# Altium footprint library 1.10-电容.PcbLib: 188 footprints (part 1 of 12)
Each footprint in its own frame and in the unit in brackets; x right, y up, seen from the top. Pads: shape width x height; smd on the part's side, far side on the other; paste and mask are expansions set on the pad; w line width, h text height; cw(c..) or ccw(c..) is an arc to the next point about the centre after c.
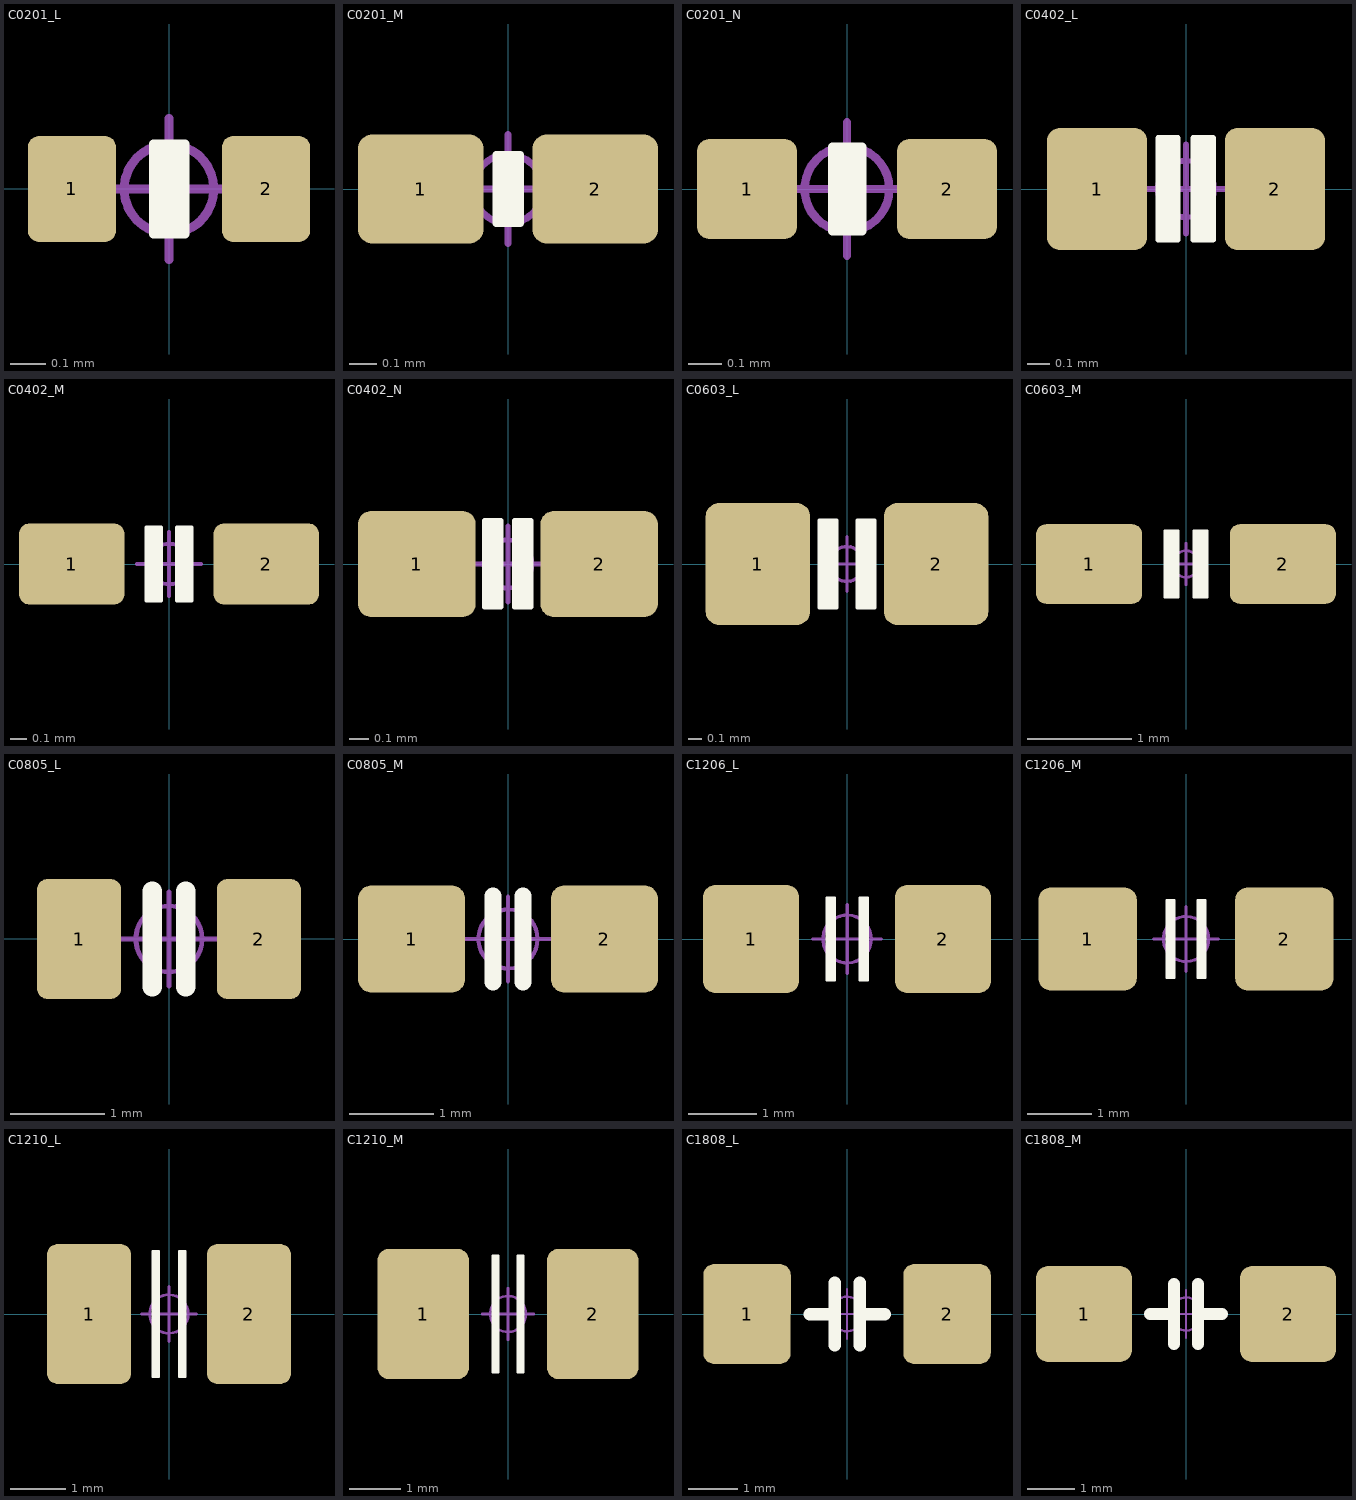
[diagram p0: the footprints below, top view; thin cyan lines are the x and y axes]

## C0201_L [mm] "无极性贴片电容"
pads (2):
  rrect25% 0.25x0.3 smd: 1(-0.275,0) 2(0.275,0)
Top Overlay:
  region: -0.044,-0.127 0.045,-0.127 0.045,0.127 -0.044,0.127
  lines w0.025: -0.044,-0.127 -0.044,0.127 0.045,0.127 0.045,-0.127 -0.044,-0.127
Mechanical 15:
  circle w0.025: c0,0 r0.127
  lines w0.025: -0.2,0 0.2,0 ; 0,-0.2 0,0.2
3D body "C 0201.STEP": height 0.34, standoff 0.02, extent -0.3,-0.16 0.3,0.16

## C0201_M [mm] "无极性贴片电容"
pads (2):
  rrect25% 0.46x0.4 smd: 1(-0.32,0) 2(0.32,0)
Top Overlay:
  region: -0.044,-0.127 0.045,-0.127 0.045,0.127 -0.044,0.127
  lines w0.025: -0.044,-0.127 -0.044,0.127 0.045,0.127 0.045,-0.127 -0.044,-0.127
Mechanical 15:
  circle w0.025: c0,0 r0.127
  lines w0.025: -0.2,0 0.2,0 ; 0,-0.2 0,0.2
3D body "C 0201.STEP": height 0.34, standoff 0.02, extent -0.3,-0.16 0.3,0.16

## C0201_N [mm] "无极性贴片电容"
pads (2):
  rrect25% 0.3x0.3 smd: 1(-0.3,0) 2(0.3,0)
Top Overlay:
  region: -0.044,-0.127 0.045,-0.127 0.045,0.127 -0.044,0.127
  lines w0.025: -0.044,-0.127 -0.044,0.127 0.045,0.127 0.045,-0.127 -0.044,-0.127
Mechanical 15:
  circle w0.025: c0,0 r0.127
  lines w0.025: -0.2,0 0.2,0 ; 0,-0.2 0,0.2
3D body "C 0201.STEP": height 0.34, standoff 0.02, extent -0.3,-0.16 0.3,0.16

## C0402_L [mm] "无极性贴片电容"
pads (2):
  rrect25% 0.45x0.55 smd: 1(-0.4,0) 2(0.4,0)
Top Overlay:
  region: 0.122,-0.228 0.033,-0.228 0.033,0.229 0.122,0.229
  region: -0.125,0.229 -0.036,0.229 -0.036,-0.228 -0.125,-0.228
  lines w0.025: -0.125,-0.228 -0.036,-0.228 -0.036,0.229 -0.125,0.229 -0.125,-0.228 ; 0.033,-0.228 0.033,0.229 0.122,0.229 0.122,-0.228 0.033,-0.228
Mechanical 15:
  circle w0.025: c0,0 r0.127
  lines w0.025: -0.2,0 0.2,0 ; 0,-0.2 0,0.2
3D body "C 0402.STEP": height 0.54, standoff 0.02, extent -0.5,-0.26 0.5,0.26

## C0402_M [mil] "无极性贴片电容"
pads (2):
  rrect25% 26x20 smd: 1(-24,0) 2(24,0)
Top Overlay:
  region: 5.5,9 2,9 2,-9 5.5,-9
  region: -5.5,-9 -2,-9 -2,9 -5.5,9
  lines w1: -5.5,-9 -2,-9 -2,9 -5.5,9 -5.5,-9 ; 2,-9 2,9 5.5,9 5.5,-9 2,-9
Mechanical 15:
  circle w1: c0,0 r5
  lines w1: -7.87,0 7.87,0 ; 0,-7.87 0,7.87
3D body "C 0402.STEP": height 21.08, standoff 0.61, extent -19.68,-10.23 19.69,10.24

## C0402_N [mm] "无极性贴片电容"
pads (2):
  rrect25% 0.62x0.56 smd: 1(-0.48,0)
  rrect26% 0.62x0.56 smd: 2(0.48,0)
Top Overlay:
  region: -0.125,0.229 -0.036,0.229 -0.036,-0.228 -0.125,-0.228
  region: 0.122,-0.228 0.033,-0.228 0.033,0.229 0.122,0.229
  lines w0.025: -0.125,-0.228 -0.125,0.229 -0.036,0.229 -0.036,-0.228 -0.125,-0.228 ; 0.033,-0.228 0.122,-0.228 0.122,0.229 0.033,0.229 0.033,-0.228
Mechanical 15:
  circle w0.025: c0,0 r0.127
  lines w0.025: -0.2,0 0.2,0 ; 0,-0.2 0,0.2
3D body "C 0402.STEP": height 0.54, standoff 0.02, extent -0.5,-0.26 0.5,0.26

## C0603_L [mil] "无极性贴片电容"
pads (2):
  rrect25% 30x35 smd: 1(-25.59,0) 2(25.59,0)
Top Overlay:
  region: 3,-12.5 3,12.5 8,12.5 8,-12.5
  region: -3,12.5 -3,-12.5 -8,-12.5 -8,12.5
  lines w1: -8,-12.5 -3,-12.5 -3,12.5 -8,12.5 -8,-12.5 ; 3,-12.5 3,12.5 8,12.5 8,-12.5 3,-12.5
Mechanical 15:
  circle w1: c0,0 r5
  lines w1: -7.87,0 7.87,0 ; 0,-7.87 0,7.87
3D body "C 0603.STEP": height 32.89, standoff 0.61, extent -31.49,-16.14 31.5,16.14

## C0603_M [mil] "无极性贴片电容"
pads (2):
  rrect25% 40x30 smd: 1(-36.5,0) 2(36.5,0)
Top Overlay:
  region: 3,-12.5 3,12.5 8,12.5 8,-12.5
  region: -3,12.5 -3,-12.5 -8,-12.5 -8,12.5
  lines w1: -8,-12.5 -3,-12.5 -3,12.5 -8,12.5 -8,-12.5 ; 3,-12.5 3,12.5 8,12.5 8,-12.5 3,-12.5
Mechanical 15:
  circle w1: c0,0 r5
  lines w1: -7.87,0 7.87,0 ; 0,-7.87 0,7.87
3D body "C 0603.STEP": height 32.89, standoff 0.61, extent -31.49,-16.14 31.5,16.14

## C0805_L [mil] "无极性贴片电容"
height 19.68
pads (2):
  rrect25% 35x50 smd: 1(-37.4,0) 2(37.4,0)
Top Overlay:
  lines w8: -7,-20 -7,20 ; 6.95,-19.99 6.95,20.01
Mechanical 15:
  circle w1.97: c0,0 r13.78
  circle w1.97: c0,0 r13.78
  lines w1.97: -19.68,0 19.68,0 -19.68,0 ; 0,-19.68 0,19.68 0,-19.68
3D body "C 0805.STEP": height 22.08, standoff 1.61, extent -39.36,-24.01 39.38,24.02

## C0805_M [mil] "无极性贴片电容"
height 19.68
pads (2):
  rrect25% 50x50 smd: 1(-45,0) 2(45,0)
Top Overlay:
  lines w8: -7,-20 -7,20 ; 6.95,-19.99 6.95,20.01
Mechanical 15:
  circle w1.97: c0,0 r13.78
  lines w1.97: -19.68,0 19.68,0 ; 0,-19.68 0,19.68
3D body "C 0805.STEP": height 22.08, standoff 1.61, extent -39.36,-24.01 39.38,24.02

## C1206_L [mil] "无极性贴片电容"
pads (2):
  rrect25% 55x62 smd: 1(-55.12,0) 2(55,0)
Top Overlay:
  region: -12,24 -7,24 -7,-24 -12,-24
  region: 12,-24 7,-24 7,24 12,24
  lines w1: -12,-24 -7,-24 -7,24 -12,24 -12,-24 ; 7,-24 7,24 12,24 12,-24 7,-24
Mechanical 15:
  circle w1.97: c0,0 r13.78
  lines w1.97: -19.68,0 19.68,0 ; 0,-19.68 0,19.68
3D body "C 1206.STEP": height 49.64, standoff 1.61, extent -62.99,-31.88 63,31.9

## C1206_M [mil] "无极性贴片电容"
pads (2):
  rrect25% 60x62.99 smd: 1(-60,0) 2(60,0)
Top Overlay:
  region: 12,-24 7,-24 7,24 12,24
  region: -12,24 -7,24 -7,-24 -12,-24
  lines w1: -12,-24 -12,24 -7,24 -7,-24 -12,-24 ; 7,-24 12,-24 12,24 7,24 7,-24
Mechanical 15:
  circle w1.97: c0,0 r13.78
  lines w1.97: -19.68,0 19.68,0 ; 0,-19.68 0,19.68
3D body "C 1206.STEP": height 49.64, standoff 1.61, extent -62.99,-31.88 63,31.9

## C1210_L [mm] "无极性贴片电容"
pads (2):
  rrect25% 1.524x2.54 smd: 1(-1.45,0) 2(1.45,0)
Top Overlay:
  region: -0.305,-1.143 -0.178,-1.143 -0.178,1.143 -0.305,1.143
  region: 0.178,-1.143 0.305,-1.143 0.305,1.143 0.178,1.143
  lines w0.025: -0.305,-1.143 -0.305,1.143 -0.178,1.143 -0.178,-1.143 -0.305,-1.143 ; 0.178,-1.143 0.178,1.143 0.305,1.143 0.305,-1.143 0.178,-1.143
Mechanical 15:
  circle w0.05: c0,0 r0.35
  lines w0.05: -0.5,0 0.5,0 ; 0,-0.5 0,0.5
3D body "C 1210.STEP": height 1.56, standoff 0.03, extent -1.6,-1.285 1.6,1.285

## C1210_M [mil] "无极性贴片电容"
pads (2):
  rrect25% 70x100 smd: 1(-65,0) 2(65,0)
Top Overlay:
  region: 7,-45 12,-45 12,45 7,45
  region: -12,-45 -7,-45 -7,45 -12,45
  lines w1: -12,-45 -7,-45 -7,45 -12,45 -12,-45 ; 7,-45 12,-45 12,45 7,45 7,-45
Mechanical 15:
  circle w1.97: c0,0 r13.78
  lines w1.97: -19.68,0 19.68,0 ; 0,-19.68 0,19.68
3D body "C 1210.STEP": height 61.43, standoff 1.2, extent -62.98,-50.59 63,50.6

## C1808_L [mil] "无极性贴片电容                  淘宝ID:黄晶宝石"
pads (2):
  rrect25% 70x80 smd: 1(-80,0) 2(80,0)
Top Overlay:
  lines w10: -30,0 -10,0 ; -10,-25 -10,25 ; 10,-25 10,25 ; 10,0 30,0
Mechanical 15:
  circle w1.97: c0,0 r13.78
  lines w1.97: -19.68,0 19.68,0 ; 0,-19.68 0,19.68
3D body "C 1808.STEP": height 61.45, standoff 1.61, extent -90.54,-39.76 90.56,39.77

## C1808_M [mil] "无极性贴片电容                  淘宝ID:黄晶宝石"
pads (2):
  rrect25% 80x80 smd: 1(-85,0) 2(85,0)
Top Overlay:
  lines w10: -30,0 -10,0 ; -10,-25 -10,25 ; 10,-25 10,25 ; 10,0 30,0
Mechanical 15:
  circle w1.97: c0,0 r13.78
  lines w1.97: -19.68,0 19.68,0 ; 0,-19.68 0,19.68
3D body "C 1808.STEP": height 61.45, standoff 1.61, extent -90.54,-39.76 90.56,39.77